# Altium footprint library EwgPassive.pcblib: 60 footprints (part 1 of 4)
Each footprint in its own frame and in the unit in brackets; x right, y up, seen from the top. Pads: shape width x height; smd on the part's side, far side on the other; paste and mask are expansions set on the pad; w line width, h text height; cw(c..) or ccw(c..) is an arc to the next point about the centre after c.
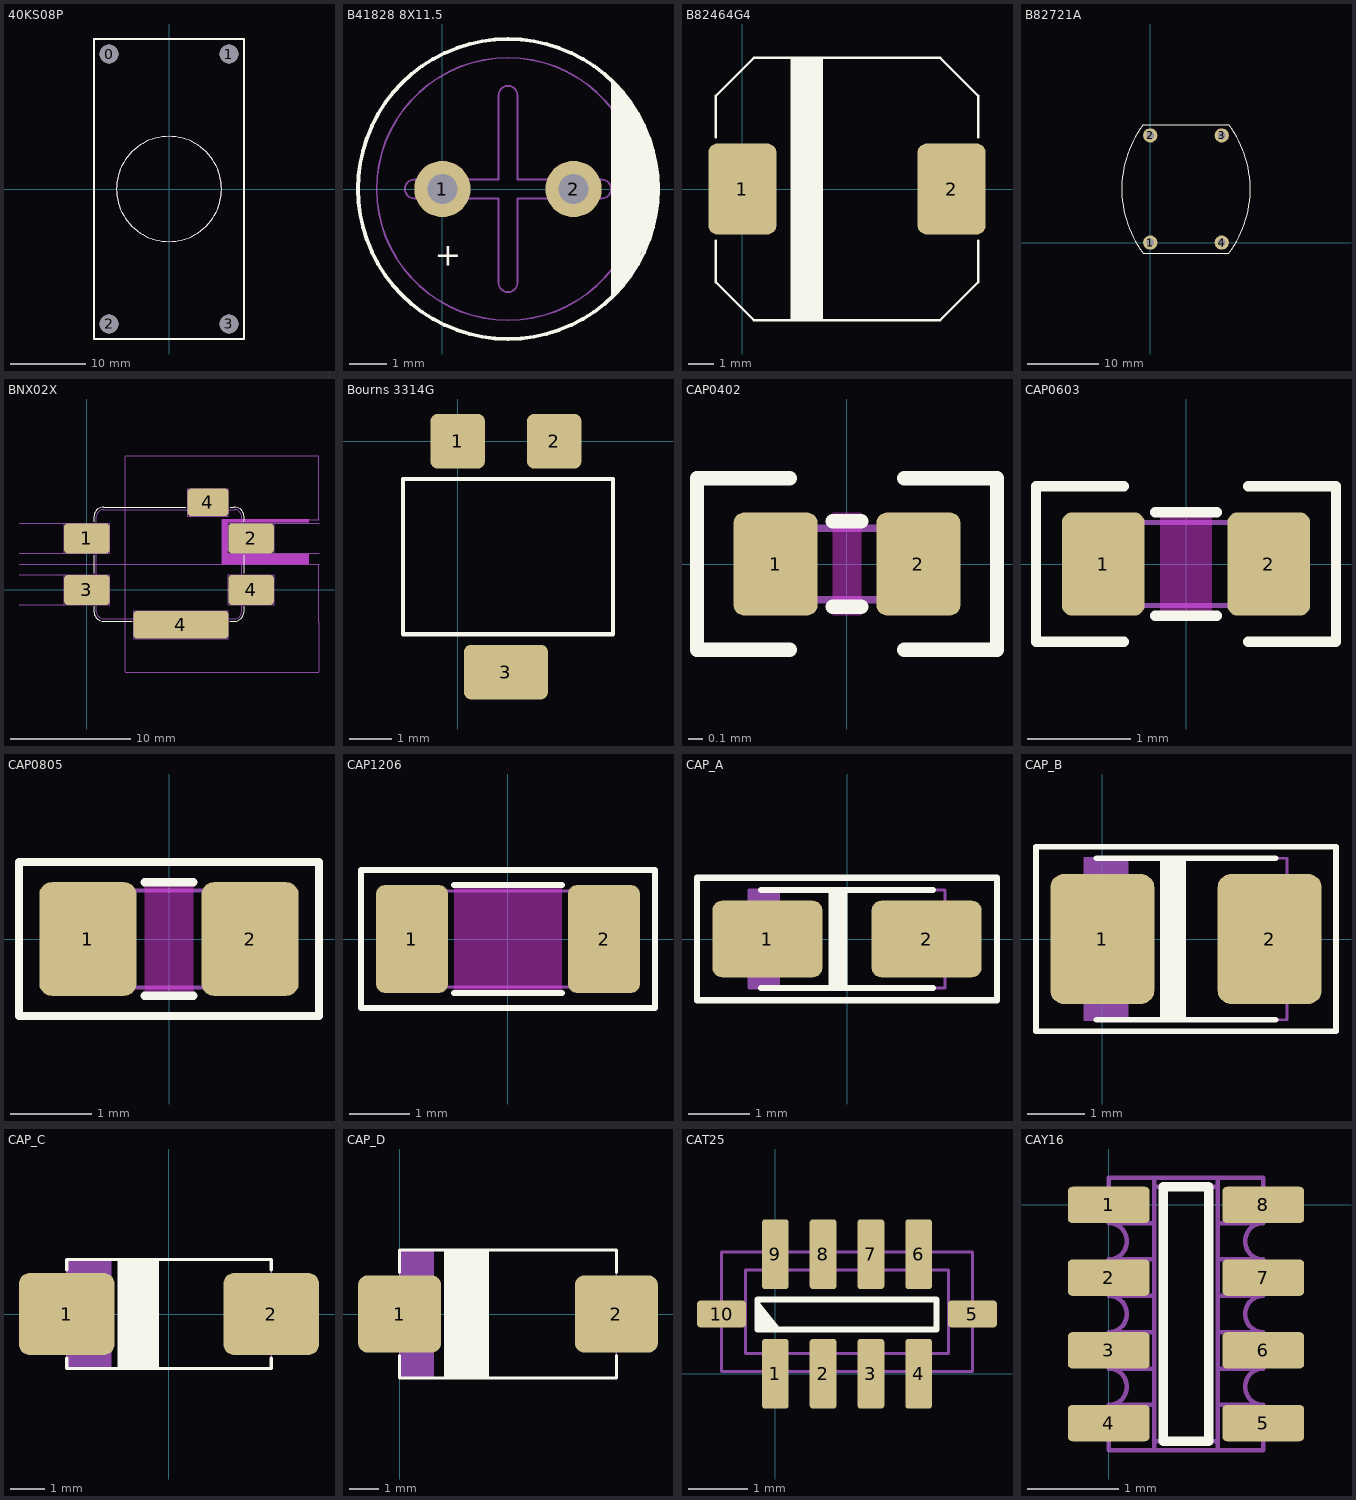
[diagram p0: the footprints below, top view; thin cyan lines are the x and y axes]

## 40KS08P [mm]
pads (4):
  round 2.5 hole 2.5: 0(-8,18) 1(8,18) 2(-8,-18) 3(8,-18)
Top Overlay:
  circle w0.1: c0,0 r7
  lines w0.254: -10,-20 -10,20 10,20 10,-20 -10,-20
Mechanical 1:
  circle w0.05: c0,0 r7
  lines w0.254: -10,-20 -10,20 10,20 10,-20 9,-20 -10,-20
3D body: height 8, standoff 0, extent -10,-20 10,20

## B41828 8X11.5 [mm]
pads (2):
  round 1.5 hole 0.8: 1(0,0) 2(3.5,0)
Top Overlay:
  circle w0.1: c1.75,0 r4
  region: 4.5,2.85 4.5,-2.85 5,-2.35 5.55,-1.2 5.75,-0.3 5.7,0.75 5.4,1.6 4.95,2.4
  text "+" at -0.2,-2.05 h0.63
Mechanical 1:
  circle w0.05: c1.75,0 r4
  circle w0.05: c1.75,0 r3.5
  lines w0.05: -0.75,-0.25 cw(c-0.75,0) -0.75,0.25 1.5,0.25 1.5,2.5 cw(c1.75,2.5) 2,2.5 2,0.25 4.25,0.25 cw(c4.25,0) 4.25,-0.25 2,-0.25 2,-2.5 cw(c1.75,-2.5) 1.5,-2.5 1.5,-0.25 -0.75,-0.25
3D body: height 13, standoff -3, extent -2.492,-4.25 6.023,4.25

## B82464G4 [mm]
pads (2):
  rrect25% 2.7x3.6 smd: 1(0,0) 2(8.3,0)
Top Overlay:
  rectangle: 1.9,-5.2 3.2,5.2
  lines w0.1: -1.05,-2.05 -1.05,-3.7 0.45,-5.2 7.85,-5.2 9.35,-3.7 9.35,-2.05 ; -1.05,2.05 -1.05,3.7 0.45,5.2 7.85,5.2 9.35,3.7 9.35,2.05
3D body: height 4.9, standoff 0, extent -1.05,-5.2 9.35,5.2

## B82721A [mm]
pads (4):
  round 2 hole 1.1: 1(0,0) 2(0,15) 3(10,15) 4(10,0)
Top Overlay:
  lines w0.15: -1,-1.5 cw(c11,7.5) -1,16.5 11,16.5 cw(c-1,7.5) 11,-1.5 -1,-1.5
3D body: height 12.61, standoff -3.2, extent -3.65,-1.45 13.65,16.45

## BNX02X [mm]
height 3.5
pads (6):
  rrect25% 3.8x2.5 smd: 1(0,4.3) 2(13.7,4.3) 3(0,0) 4(13.7,0)
  rrect25% 7.9x2.3 smd: 4(7.85,-2.9)
  rrect25% 3.4x2.3 smd: 4(10.1,7.3)
Top Overlay:
  lines w0.1: 0.6,-1.375 0.6,-1.8 ccw(c1.4,-1.8) 1.4,-2.6 3.775,-2.6 ; 0.6,1.4 0.6,2.15 0.6,2.9 ; 0.6,5.7 0.6,6.1 cw(c1.4,6.1) 1.4,6.9 8.25,6.9 ; 11.925,-2.6 12.3,-2.6 ccw(c12.3,-1.8) 13.1,-1.8 13.1,-1.375 ; 11.95,6.9 12.3,6.9 cw(c12.3,6.1) 13.1,6.1 13.1,5.85 13.1,5.675 ; 13.1,1.375 13.1,2.15 13.1,2.9
Mechanical 1:
  lines w0.01: -5.65,2.15 19.325,2.15
  lines w0.05: -5.65,-1.25 -1.9,-1.25 ; -5.65,1.25 -1.9,1.25 ; -5.65,3.05 -1.9,3.05 ; -5.65,5.55 -1.9,5.55 ; 3.2,-6.85 19.35,-6.85 ; 3.2,11.175 19.35,11.175 ; 15.6,3.05 19.35,3.05 ; 15.6,5.55 19.35,5.55
  lines w0.1: 0.6,-1.25 0.6,1.25 ; 0.6,3.05 0.6,5.55 ; 3.2,-6.825 3.2,11.15 ; 3.9,-2.6 11.8,-2.6 ; 8.4,6.9 11.8,6.9 ; 13.1,-1.25 13.1,1.25 ; 13.1,3.05 13.1,5.55 ; 19.35,-6.825 19.35,-2.669 ; 19.35,5.85 11.3,5.85 11.3,2.15 19.35,2.15 19.35,-2.669 ; 19.35,5.875 19.35,11.15 ; 19.35,-2.669 19.35,-2.669 ; -1.9,-1.25 1.9,-1.25 1.9,1.25 -1.9,1.25 -1.9,-1.25 ; -1.9,3.05 1.9,3.05 1.9,5.55 -1.9,5.55 -1.9,3.05 ; 0.8,-1.8 ccw(c1.4,-1.8) 1.4,-2.4 12.3,-2.4 ccw(c12.3,-1.8) 12.9,-1.8 12.9,6.1 ccw(c12.3,6.1) 12.3,6.7 1.4,6.7 ccw(c1.4,6.1) 0.8,6.1 0.8,-1.8 ; 3.9,-4.05 11.8,-4.05 11.8,-1.75 3.9,-1.75 3.9,-4.05 ; 8.4,6.15 11.8,6.15 11.8,8.45 8.4,8.45 8.4,6.15 ; 11.8,-1.25 15.6,-1.25 15.6,1.25 11.8,1.25 11.8,-1.25 ; 11.8,3.05 15.6,3.05 15.6,5.55 11.8,5.55 11.8,3.05
  text "GND" at 13.575,8.225 h1
  text "GND" at 13.6,-4.225 h1
  text "BNX023" at 3.925,2.5 h1
Mechanical 1 keep-out:
  region: 18.5,5.875 11.3,5.875 11.3,2.15 18.5,2.15 18.5,2.975 11.725,2.975 11.725,5.625 18.5,5.625
3D body: height 3.1, standoff 0, extent 0.775,-2.4 12.875,6.7

## Bourns 3314G [mm]
pads (3):
  rrect25% 1.3x1.3 smd: 1(0,0) 2(2.3,0)
  rrect25% 2x1.3 smd: 3(1.15,-5.5)
Top Overlay:
  lines w0.1: -1.3,-4.6 -1.3,-0.9 3.7,-0.9 3.7,-4.6 -1.3,-4.6
3D body: height 2.55, standoff 0, extent -1.3,-5.8 3.7,0.4

## CAP0402 [mm]
pads (2):
  rrect25% 0.59x0.72 smd: 1(-0.5,0) 2(0.5,0)
Top Layer keep-out:
  region: -0.1,0.36 -0.1,-0.36 0.1,-0.36 0.1,0.36
Top Overlay:
  lines w0.1: -0.4,-0.6 -1.05,-0.6 -1.05,0.6 -0.4,0.6 ; -0.1,-0.3 0.1,-0.3 ; -0.1,0.3 0.1,0.3 ; 0.4,-0.6 1.05,-0.6 1.05,0.6 0.4,0.6
Mechanical 1:
  lines w0.05: -0.3,0.25 -0.3,-0.25 -0.5,-0.25 ; 0.3,-0.25 0.3,0.25 ; -0.5,-0.25 -0.5,0.25 0.5,0.25 0.5,-0.25 -0.5,-0.25
3D body: height 0.49, standoff -0.01, extent -0.5,-0.25 0.5,0.25

## CAP0603 [mm]
pads (2):
  rrect25% 0.8x1 smd: 1(-0.8,0) 2(0.8,0)
Top Layer keep-out:
  region: -0.25,0.5 -0.25,-0.5 0.25,-0.5 0.25,0.5
Top Overlay:
  lines w0.1: -0.6,-0.75 -1.45,-0.75 -1.45,0.75 -0.6,0.75 ; -0.3,-0.5 0.3,-0.5 ; -0.3,0.5 0.3,0.5 ; 0.6,-0.75 1.45,-0.75 1.45,0.75 0.6,0.75
Mechanical 1:
  lines w0.05: -0.5,-0.4 -0.5,0.4 ; 0.5,-0.4 0.5,0.4 ; -0.8,-0.4 0.8,-0.4 0.8,0.4 -0.8,0.4 -0.8,-0.4
3D body: height 0.65, standoff 0, extent -0.8,-0.4 0.8,0.4

## CAP0805 [mm]
pads (2):
  rrect25% 1.2x1.4 smd: 1(-1,0) 2(1,0)
Top Layer keep-out:
  region: -0.3,-0.7 0.3,-0.7 0.3,0.7 -0.3,0.7
Top Overlay:
  lines w0.1: -0.3,-0.7 0.3,-0.7 ; -0.3,0.7 0.3,0.7 ; -1.85,-0.95 1.85,-0.95 1.85,0.95 -1.85,0.95 -1.85,-0.95
Mechanical 1:
  lines w0.05: -0.5,-0.6 -0.5,0.6 ; 0.5,-0.6 0.5,0.6 ; -1,-0.6 -1,0.6 1,0.6 1,-0.6 -1,-0.6
3D body: height 1, standoff 0, extent -1,-0.625 1,0.625

## CAP1206 [mm]
pads (2):
  rrect25% 1.2x1.8 smd: 1(-1.6,0) 2(1.6,0)
Top Layer keep-out:
  region: -0.9,-0.9 0.9,-0.9 0.9,0.9 -0.9,0.9
Top Overlay:
  lines w0.1: -0.9,-0.9 0.9,-0.9 ; -0.9,0.9 0.9,0.9 ; -2.45,-1.15 -2.45,1.15 2.45,1.15 2.45,-1.15 -2.45,-1.15
Mechanical 1:
  lines w0.05: -1.1,-0.8 -1.1,0.8 ; 1.1,-0.8 1.1,0.8 ; -1.6,-0.8 -1.6,0.8 1.6,0.8 1.6,-0.8 -1.6,-0.8
3D body: height 1, standoff 0, extent -1.6,-0.8 1.6,0.8

## CAP_A [mm]
pads (2):
  rrect25% 1.8x1.25 smd: 1(-1.3,0) 2(1.3,0)
Top Overlay:
  region: -0.3,0.8 -0.3,-0.8 0,-0.8 0,0.8
  lines w0.1: -1.4,-0.8 1.4,-0.8 ; -1.4,0.8 1.4,0.8 ; -2.45,-1 2.45,-1 2.45,1 -2.45,1 -2.45,-1
Mechanical 1:
  region: -1.6,-0.8 -1.1,-0.8 -1.1,0.8 -1.6,0.8
  lines w0.05: -1.6,-0.8 -1.6,0.8 1.6,0.8 1.6,-0.8 -1.6,-0.8
3D body: height 1.61, standoff 0, extent -1.6,-0.8 1.6,0.8

## CAP_B [mm]
pads (2):
  rrect25% 1.8x2.25 smd: 1(0,0) 2(2.9,0)
Top Overlay:
  region: 1.45,-1.4 1.45,1.4 1,1.4 1,-1.4
  lines w0.1: -0.1,-1.4 3,-1.4 ; -0.1,1.4 3,1.4 ; -1.15,-1.6 4.05,-1.6 4.05,1.6 -1.15,1.6 -1.15,-1.6
Mechanical 1:
  region: -0.3,-1.4 0.45,-1.4 0.45,1.4 -0.3,1.4
  lines w0.05: -0.3,-1.4 -0.3,1.4 3.2,1.4 3.2,-1.4 -0.3,-1.4
3D body: height 1.91, standoff 0, extent -0.3,-1.425 3.2,1.375

## CAP_C [mm]
pads (2):
  rrect25% 2.8x2.4 smd: 1(-3,0) 2(3,0)
Top Overlay:
  region: -0.3,-1.6 -0.3,1.6 -1.5,1.6 -1.5,-1.6
  lines w0.1: -3,-1.3 -3,-1.6 3,-1.6 3,-1.3 ; -3,1.3 -3,1.6 3,1.6 3,1.3
Mechanical 1:
  region: -1.7,1.6 -3,1.6 -3,-1.6 -1.7,-1.6
  lines w0.05: -3,-1.6 3,-1.6 3,1.6 -3,1.6 -3,-1.6
3D body: height 2.55, standoff 0, extent -3,-1.6 3,1.6

## CAP_D [mm]
pads (2):
  rrect25% 2.8x2.6 smd: 1(0,0) 2(7.3,0)
Top Overlay:
  region: 1.5,2.15 1.5,-2.15 3,-2.15 3,2.15
  lines w0.1: 0,-1.4 0,-2.15 7.3,-2.15 7.3,-1.4 ; 0,1.4 0,2.15 7.3,2.15 7.3,1.4
Mechanical 1:
  region: 0,2.15 0,-2.15 1.15,-2.15 1.15,2.15
  lines w0.05: 0,-2.15 0,2.15 7.3,2.15 7.3,-2.15 0,-2.15
3D body: height 2.81, standoff 0, extent 0.025,-2.15 7.325,2.15

## CAT25 [mm]
pads (10):
  rrect25% 0.45x1.17 smd: 1(0,0) 2(0.8,0) 3(1.6,0) 4(2.4,0) 6(2.4,2) 7(1.6,2) 8(0.8,2) 9(0,2)
  rrect25% 0.82x0.45 smd: 5(3.3,1) 10(-0.9,1)
Top Overlay:
  region: -0.3,1.24 -0.3,0.74 0.1,0.74
  lines w0.1: -0.3,0.74 -0.3,1.24 2.7,1.24 2.7,0.74 -0.3,0.74
Mechanical 1:
  lines w0.05: -0.9,0.84 -0.5,0.84 ; -0.9,1.14 -0.5,1.14 ; -0.1,0.04 -0.1,0.34 ; -0.1,1.74 -0.1,2.04 ; 0.1,0.04 0.1,0.34 ; 0.1,1.74 0.1,2.04 ; 0.7,0.04 0.7,0.34 ; 0.7,1.74 0.7,2.04 ; 0.9,0.04 0.9,0.34 ; 0.9,1.74 0.9,2.04 ; 1.5,0.04 1.5,0.34 ; 1.5,1.74 1.5,2.04 ; 1.7,0.04 1.7,0.34 ; 1.7,1.74 1.7,2.04 ; 2.3,0.04 2.3,0.34 ; 2.3,1.74 2.3,2.04 ; 2.5,0.04 2.5,0.34 ; 2.5,1.74 2.5,2.04 ; 2.9,0.84 3.3,0.84 ; 2.9,1.14 3.3,1.14 ; -0.9,0.04 -0.9,2.04 3.3,2.04 3.3,0.04 -0.9,0.04 ; -0.5,0.34 -0.5,1.74 2.9,1.74 2.9,0.34 -0.5,0.34

## CAY16 [mm]
pads (8):
  rrect25% 0.9x0.4 smd: 1(0,0) 2(0,-0.8) 3(0,-1.6) 4(0,-2.4) 5(1.7,-2.4) 6(1.7,-1.6) 7(1.7,-0.8) 8(1.7,0)
Top Overlay:
  lines w0.1: 0.6,-2.6 0.6,0.2 1.1,0.2 1.1,-2.6 0.6,-2.6
Mechanical 1:
  lines w0.05: 0.5,-2.7 0.5,-2.2 0.1,-2.2 0,-2.2 ; 0.5,-1.8 0,-1.8 ; 0.5,-1.4 0.1,-1.4 0,-1.4 ; 0.5,-1 0,-1 ; 0.5,-0.6 0,-0.6 ; 0.5,0.3 0.5,-0.2 0.1,-0.2 0,-0.2 ; 1.2,-2.7 1.2,-2.2 1.7,-2.2 ; 1.2,-1.8 1.7,-1.8 ; 1.2,-1.4 1.7,-1.4 ; 1.2,-1 1.7,-1 ; 1.2,-0.6 1.3,-0.6 1.7,-0.6 ; 1.2,0.3 1.2,-0.2 1.7,-0.2 ; 0,-2.2 ccw(c0,-2) 0,-1.8 ; 0,-2.2 0,-2.7 1.7,-2.7 1.7,-2.2 ; 0,-1.8 0,-1.4 ; 0,-1.4 ccw(c0,-1.2) 0,-1 ; 0,-1 0,-0.6 ; 0,-0.6 ccw(c0,-0.4) 0,-0.2 ; 0,-0.2 0,0.3 1.7,0.3 1.7,-0.2 ; 1.7,-2.2 cw(c1.7,-2) 1.7,-1.8 ; 1.7,-1.8 1.7,-1.4 ; 1.7,-1.4 cw(c1.7,-1.2) 1.7,-1 ; 1.7,-1 1.7,-0.6 ; 1.7,-0.6 cw(c1.7,-0.4) 1.7,-0.2 ; 0.5,-2.6 0.5,0.2 1.2,0.2 1.2,-2.6 0.5,-2.6
3D body: height 0.73, standoff 0, extent -0.45,-2.8 2.15,0.4